# Altium schematic symbol library THU VIEN SCH.SchLib: 1083 symbols (part 1 of 5) (continued)
## LED2 (continued)
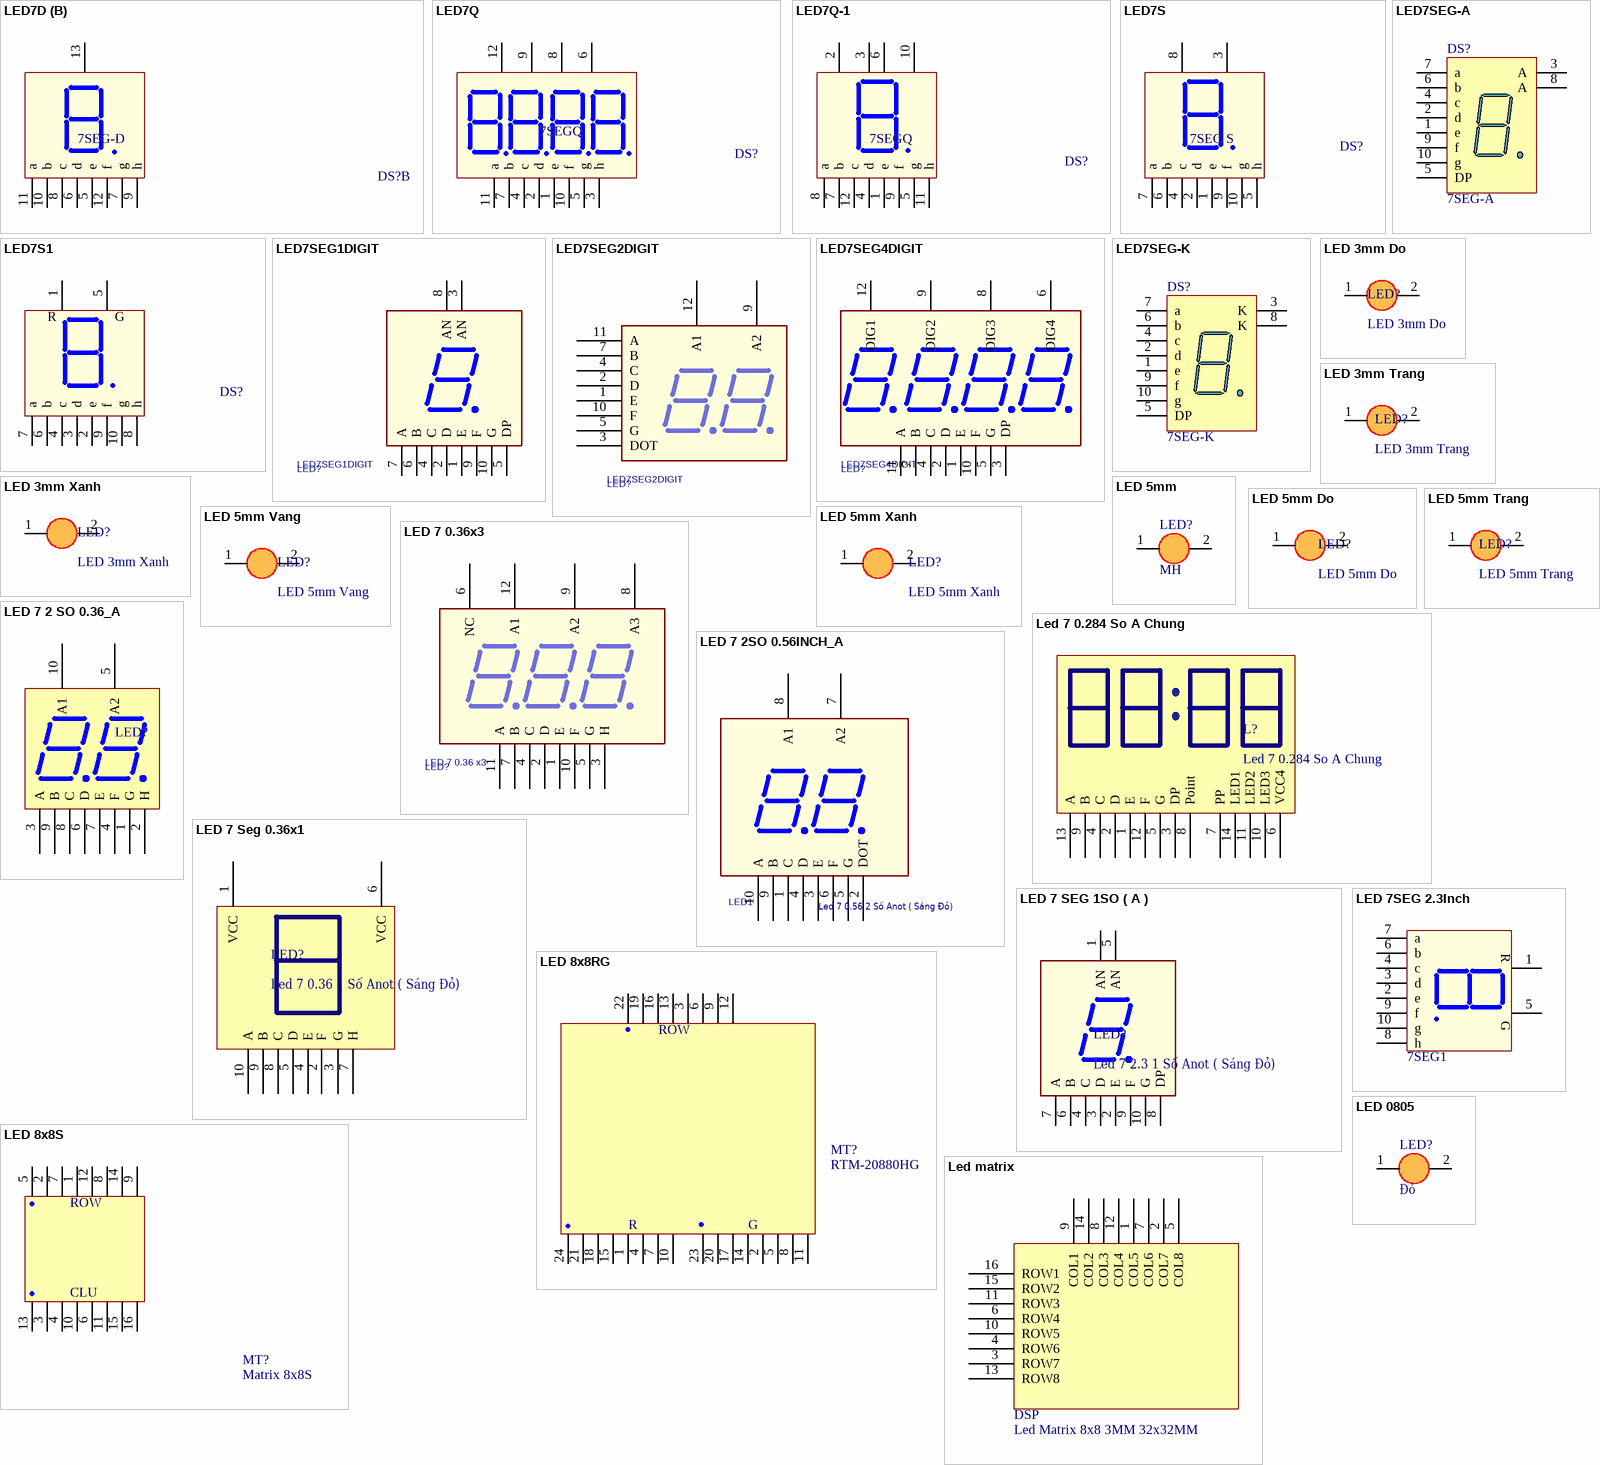
[diagram p5: symbols LED7D to Led matrix]

## LED7D
designator DS?, comment 7SEG-D
Two 7 Seg Dipslay; Value: LED 7D SEG
footprint 7SEGD (DIP 18Leads; Body 24 x 15 mm; Pitch 0.5 mm)
part A pins: 1 e, 2 d, 3 c, 4 h, 14 V1, 15 b, 16 a, 17 g, 18 f
part B pins: 5 e, 6 d, 7 g, 8 c, 9 h, 10 b, 11 a, 12 f, 13 V2

## LED7Q
designator DS?, comment 7SEGQ
Four 7 Seg Dipslay; Value: LED 7Q SEG
footprint 7SEGQ (DIP 12 Leads; Body 48 x 20 mm; Pitch 0.5 mm)
pins: 1 e, 2 d, 3 h, 4 c, 5 g, 6 V4, 7 b, 8 V3, 9 V2, 10 f, 11 a, 12 V1

## LED7Q-1
designator DS?, comment 7SEGQ
Four 7 Seg Dipslay; Value: LED 7Q SEG
footprint 7SEGQ (DIP 12 Leads; Body 48 x 20 mm; Pitch 0.5 mm)
pins: 1 e, 2 V1, 3 V2, 4 d, 5 g, 6 V3, 7 b, 8 a, 9 f, 10 V4, 11 h, 12 c

## LED7S
designator DS?, comment 7SEG S
Single 7 Seg Dipslay; Value: LED 7S SEG
footprint 7SEGS (DIP 10 Leads; Body 12 x 15 mm; Pitch 0.5 mm)
pins: 1 e, 2 d, 3 Vcc, 4 c, 5 h, 6 b, 7 a, 8 Vcc, 9 f, 10 g

## LED7S1
designator DS?, comment 7SEG S  (value not drawn)
Single 7 Seg Dipslay 29x41 mm; Value: LED 7S SEG
footprint 7SEG_29x41 (DIP 10 Leads; Body 29 x 41 mm; Pitch 0.5 mm)
footprint 7SEG_37x55 (DIP 10 Leads; Body 29 x 41 mm; Pitch 0.5 mm)
pins: 1 R, 2 e, 3 d, 4 c, 5 COM, 6 b, 7 a, 8 h, 9 f, 10 g
text: G

## LED7SEG1DIGIT
designator LED?
footprint LED 7SEG 1DIGIT
pins: 1 E, 2 D, 3 AN, 4 C, 5 DP, 6 B, 7 A, 8 AN, 9 F, 10 G

## LED7SEG2DIGIT
designator LED?
footprint Led 7seg 3 digit (DIP; 14 Leads (2 Absent); Row Spacing 7.62 mm; Pitch 2.54 mm)
pins: 1 E, 2 D, 3 DOT, 4 C, 5 G, 7 B, 9 A2, 10 F, 11 A, 12 A1

## LED7SEG4DIGIT
designator LED?
footprint LED 7SEG 4 DIGIT (LED 7SEG 4DIGIT)
pins: 1 E, 2 D, 3 DP, 4 C, 5 G, 6 DIG4, 7 B, 8 DIG3, 9 DIG2, 10 F, 11 A, 12 DIG1

## LED7SEG-A
designator DS?, comment 7SEG-A
14.2 mm General Purpose Blue 7-Segment Display: CA, RH DP, Gray Surface; MinimumIntensity: 2020 ucd; Note: IF = 10 mA; Published: 8-Jun-2000; LatestRevisionDate: 17-Dec-2003; LatestRevisionNote: Schematic revised, PCB Footprint replaced.; DatasheetDocument: 24-Sep-2002; PackageDocument: 24-Sep-2002; PackageReference: H; Publisher: Altium Limited; Colour: Blue; ComponentLink1Description: Manufacturer Link; ComponentLink1URL: http://www.agilent.com/
footprint LED7SEG
footprint LED 7SEG 0.8IN ANOT
pins: 1 e "Cathode", 2 d "Cathode", 3 A "Common Anode", 4 c "Cathode", 5 DP "Cathode", 6 b "Cathode", 7 a "Cathode", 8 A "Common Anode", 9 f "Cathode", 10 g "Cathode"

## LED7SEG-K
designator DS?, comment 7SEG-K
14.2 mm General Purpose Blue 7-Segment Display: CC, RH DP, Gray Surface; MinimumIntensity: 2020 ucd; Note: IF = 10 mA; Published: 8-Jun-2000; LatestRevisionDate: 17-Dec-2003; LatestRevisionNote: Schematic revised, PCB Footprint replaced.; DatasheetDocument: 24-Sep-2002; PackageDocument: 24-Sep-2002; PackageReference: H; Publisher: Altium Limited; Colour: Blue; ComponentLink1Description: Manufacturer Link; ComponentLink1URL: http://www.agilent.com/
footprint LED7SEG
pins: 1 e "Anode", 2 d "Anode", 3 K "Common Cathode", 4 c "Anode", 5 DP "Anode", 6 b "Anode", 7 a "Anode", 8 K "Common Cathode", 9 f "Anode", 10 g "Anode"

## LED 3mm Do
designator LED?
Cắm; Ten_Linh_Kien: LED 3MM Sáng Đỏ ( SS); Ma_Hang: MH004931; Don_Vi: Con; Ghi_Chu: *; Kieu_Chan: *; Chung_Loai: Cắm
footprint LED 3mm Do (Footprintf LED phi 3)
pins: 1 A, 2 K

## LED 3mm Trang
designator LED?
Cắm; Ten_Linh_Kien: LED 3MM Sáng Trắng ( SS); Ma_Hang: MH004932; Don_Vi: Con; Ghi_Chu: *; Kieu_Chan: *; Chung_Loai: Cắm
footprint LED_phi 3 (LED phi 3)
pins: 1 A, 2 K

## LED 3mm Xanh
designator LED?
Cắm; Ten_Linh_Kien: LED 3MM Xanh Lá ( SS); Ma_Hang: MH004935; Don_Vi: Con; Ghi_Chu: *; Kieu_Chan: *; Chung_Loai: Cắm
footprint LED 3MM XANH
pins: 1 A, 2 K

## LED 5mm
designator LED?, comment MH
Cắm; Don_Vi: Con; Ten_Linh_Kien: *; Ghi_Chu: *; Kieu_Chan: *; Ma_Hang: *; Chung_Loai: Con
footprint LED5MM
pins: 1 A, 2 K

## LED 5mm Do
designator LED?
Cắm; Ten_Linh_Kien: LED 3MM Xanh Lá ( SS); Ma_Hang: MH004935; Don_Vi: Con; Ghi_Chu: *; Kieu_Chan: *; Chung_Loai: Cắm
footprint LED 5mm DO (LED 2 PIN, 5 ly , Only colour, pin to pin 110mil)
pins: 1 A, 2 K

## LED 5mm Trang
designator LED?
Cắm; Ten_Linh_Kien: Led 5MM Trắng (SS); Ma_Hang: MH002127; Don_Vi: Con; Ghi_Chu: *; Kieu_Chan: *; Chung_Loai: Cắm
footprint LED 5mm DO (LED 2 PIN, 5 ly , Only colour, pin to pin 110mil)
pins: 1 A, 2 K

## LED 5mm Vang
designator LED?
Cắm; Ten_Linh_Kien: Led 5MM Vàng (SS); Ma_Hang: MH002126; Don_Vi: Con; Ghi_Chu: *; Kieu_Chan: *; Chung_Loai: Cắm
footprint LED 5mm Vang
pins: 1 A, 2 K

## LED 5mm Xanh
designator LED?
Cắm; Ten_Linh_Kien: Led 5MM Xanh Lá (SS); Ma_Hang: MH002125; Don_Vi: Con; Ghi_Chu: *; Kieu_Chan: *; Chung_Loai: Cắm
footprint LED 5mm Xanh (LED 2 PIN, 5 ly , Only colour,pin to pin 100mil)
pins: 1 A, 2 K

## LED 7 0.36x3
designator LED?, comment LED 7 0.36 x3
footprint Led 7seg 3 digit (DIP; 14 Leads (2 Absent); Row Spacing 7.62 mm; Pitch 2.54 mm)
pins: 1 E, 2 D, 3 H, 4 C, 5 G, 6 NC, 7 B, 8 A3, 9 A2, 10 F, 11 A, 12 A1

## Led 7 0.284 So A Chung
designator L?
Cắm; Ten_Linh_Kien: Led 7 0.28 4 Số Anot ( Màu Đỏ); Don_Vi: Con; Ma_Hang: MH003649; Ghi_Chu: *; Kieu_Chan: *; Chung_Loai: Cắm
footprint Led 7 Thanh 0.56 - Clock
pins: 1 E, 2 D, 3 DP, 4 C, 5 G, 6 VCC4, 7 PP, 8 Point, 9 B, 10 LED3, 11 LED2, 12 F, 13 A, 14 LED1

## LED 7 2 SO 0.36_A
designator LED?, comment Led 7 0.36 3 Số Anot ( Sáng Đỏ)  (value not drawn)
Cắm; Don_Vi: Con; Ma_Hang: MH001046; Ten_Linh_Kien: Led 7 0.36 3 Số Anot ( Sáng Đỏ); Ghi_Chu: *; Kieu_Chan: *; Chung_Loai: Cắm
footprint 7 Seg 0.36x2
pins: 1 G, 2 H, 3 A, 4 F, 5 A2, 6 D, 7 E, 8 C, 9 B, 10 A1

## LED 7 2SO 0.56INCH_A
designator LED1, comment Led 7 0.56 2 Số Anot ( Sáng Đỏ)
Cắm; Ma_Hang: MH001040; Don_Vi: Con; Ten_Linh_Kien: Led 7 0.56 2 Số Anot ( Sáng Đỏ); Ghi_Chu: *; Kieu_Chan: *; Chung_Loai: Cắm
footprint LED 7SEGx2 0.56
pins: 1 C, 2 DOT, 3 E, 4 D, 5 G, 6 F, 7 A2, 8 A1, 9 B, 10 A

## LED 7 Seg 0.36x1
designator LED?, comment Led 7 0.36 1 Số Anot ( Sáng Đỏ)
Cắm; Don_Vi: Con; Ma_Hang: MH001607; Ten_Linh_Kien: Led 7 0.36 1 Số Anot ( Sáng Đỏ); Ghi_Chu: *; Kieu_Chan: *; Chung_Loai: Cắm
footprint 7SEG_0.36 (led 7 - 0.36 - 10 pin)
pins: 1 VCC, 2 F, 3 G, 4 E, 5 D, 6 VCC, 7 H, 8 C, 9 B, 10 A

## LED 7 SEG 1SO ( A )
designator LED?, comment Led 7 2.3 1 Số Anot ( Sáng Đỏ)
Cắm; Don_Vi: Con; Ma_Hang: MH000901; Ten_Linh_Kien: Led 7 2.3 1 Số Anot ( Sáng Đỏ); Ghi_Chu: *; Kieu_Chan: *; Chung_Loai: Cắm
pins: 1 AN, 2 E, 3 D, 4 C, 5 AN, 6 B, 7 A, 8 DP, 9 F, 10 G

## LED 7SEG 2.3Inch
designator 7SEG1, comment Led 7 Thanh 2.3 Inch Anot  (value not drawn)
Single 7 Seg Dipslay 29x41 mm; Value: LED 7S SEG
footprint LED 7 THANH 2.3INCH
footprint 7SEG_37x55 (DIP 10 Leads; Body 29 x 41 mm; Pitch 0.5 mm)
footprint LED 7 Thanh 2.3INCH
pins: 1 R, 2 e, 3 d, 4 c, 5 COM, 6 b, 7 a, 8 h, 9 f, 10 g
text: G

## LED 8x8RG
designator MT?, comment RTM-20880HG
Matrix 8x8, Two colour; Value: Matrix 8x8 two colour
footprint 8x8RG (Matran 8x8 2mau,Body 60 X 60mm)
pins: 1 R5, 2 G5, 3 H5, 4 R6, 5 G6, 6 H6, 7 R7, 8 G7, 9 H7, 10 R8, 11 G8, 12 H8, 13 H4, 14 G4, 15 R4, 16 H3, 17 G3, 18 R3, 19 H2, 20 G2, 21 R2, 22 H1, 23 G1, 24 R1
text: ROW; R; G

## LED 8x8S
designator MT?, comment Matrix 8x8S
Matrix 8x8,  Single colour; Value: Matrix 8x8S
footprint 8x8S (Matran 8x8, Body 60 X 60mm)
pins: 1 H4, 2 H2, 3 C2, 4 C3, 5 H1, 6 C5, 7 H3, 8 H6, 9 H8, 10 C4, 11 C6, 12 H5, 13 C1, 14 H7, 15 C7, 16 C8
text: ROW; CLU

## LED 0805
designator LED?, comment Đỏ
Dán; Don_Vi: Con; Chung_Loai: Cắm; Ten_Linh_kien: *; Ghi_Chu: *; Kieu_Chan: *; Ma_Hang: *
footprint led 0805
pins: 1 A, 2 K

## Led matrix
designator DSP, comment Led Matrix 8x8 3MM 32x32MM
Cắm; Ten_Linh_Kien: Led Matrix 8x8 3MM 32x32MM ( 1 Mầu Katot); Don_Vi: Con; Ma_Hang: MH003635; Ghi_Chu: *; Kieu_Chan: *; Chung_Loai: Cắm
footprint Matrix SBM1388 (Matrix 8x8)
pins: 1 COL5, 2 COL7, 3 ROW7, 4 ROW6, 5 COL8, 6 ROW4, 7 COL6, 8 COL3, 9 COL1, 10 ROW5, 11 ROW3, 12 COL4, 13 ROW8, 14 COL2, 15 ROW2, 16 ROW1

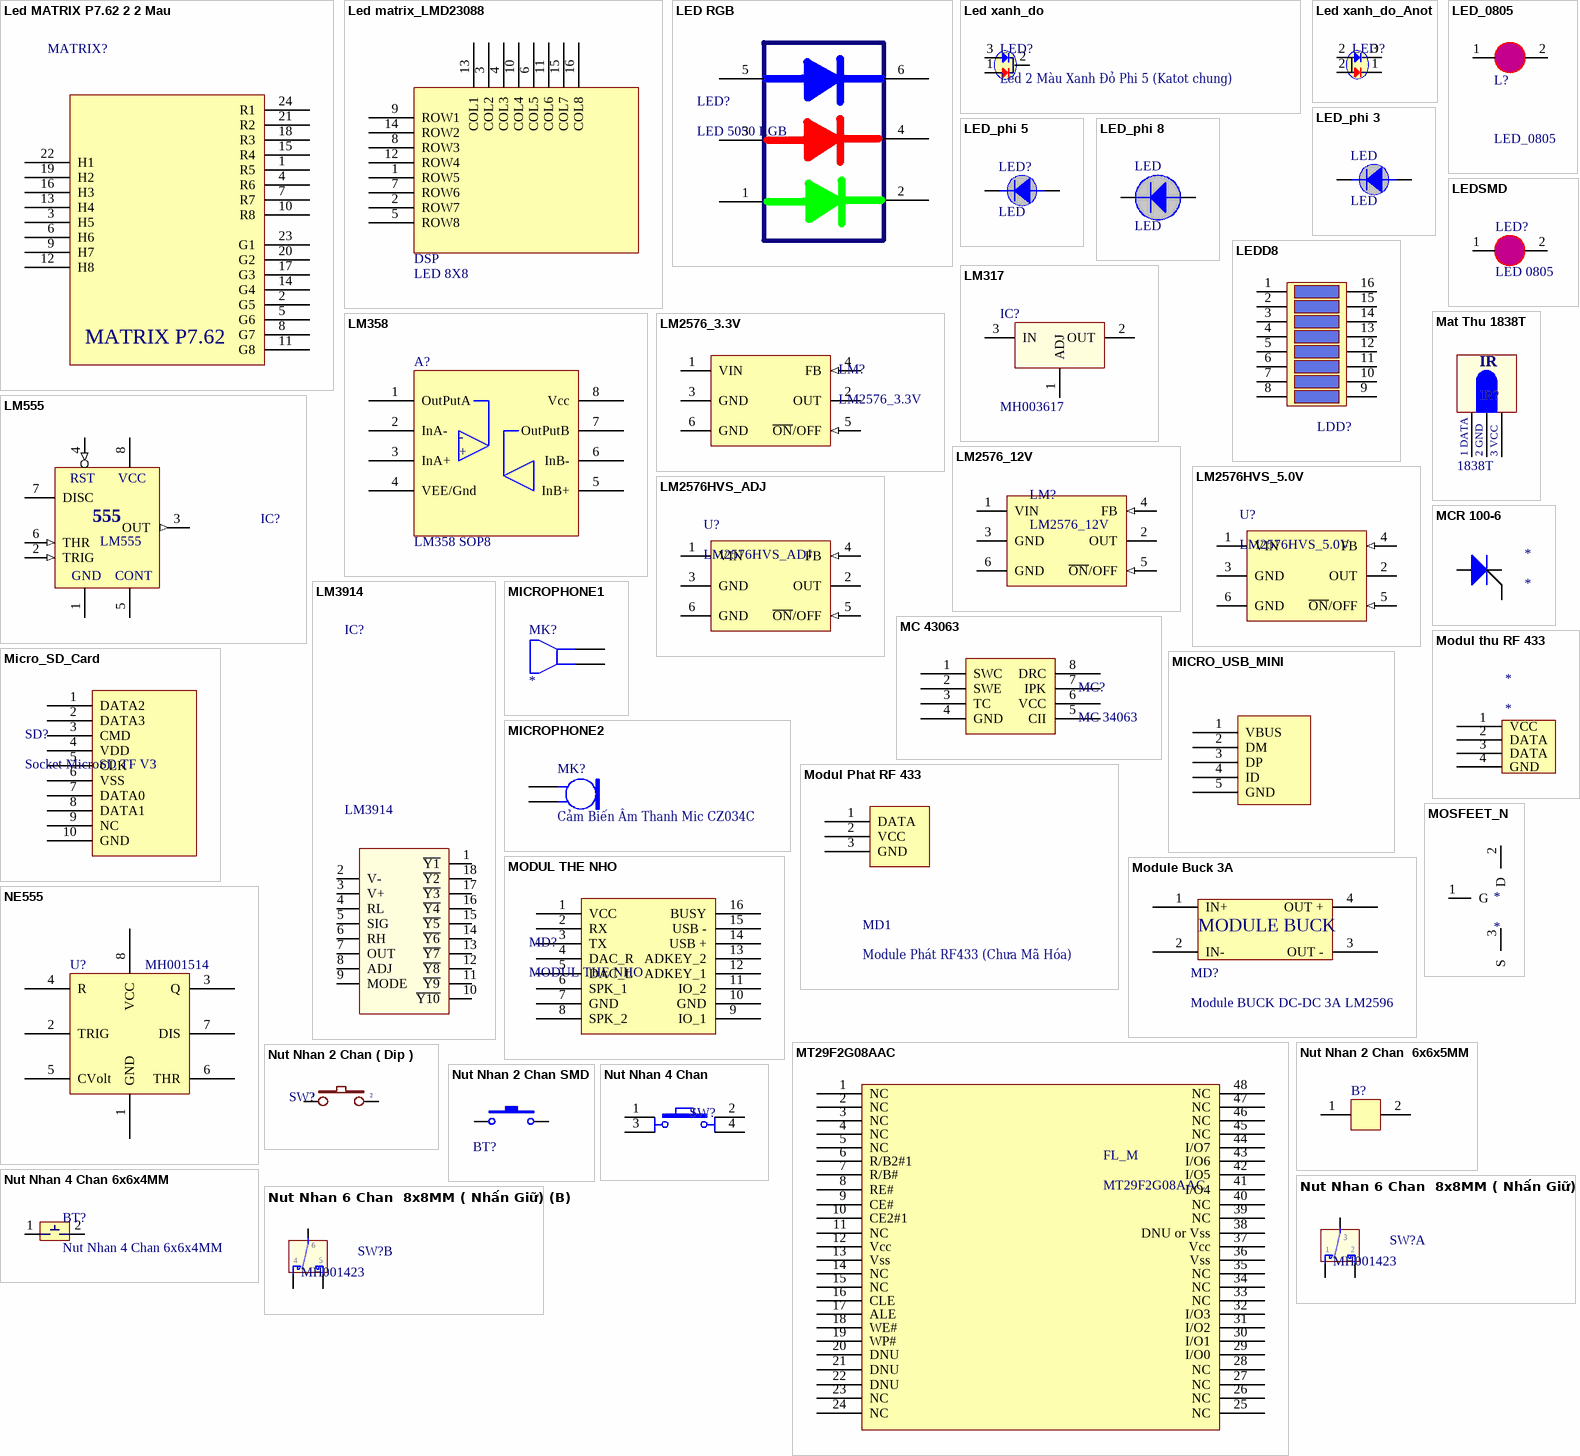
[diagram p6: symbols Led MATRIX P7.62 2 2 Mau to Nut Nhan 6 Chan  8x8MM ( Nhấn Giữ)]

## Led MATRIX P7.62 2 2 Mau
designator MATRIX?, comment LED Matrix P7.62 3 Màu  (value not drawn)
footprint LED Matrix P7.62
pins: 1 R5, 2 G5, 3 H5, 4 R6, 5 G6, 6 H6, 7 R7, 8 G7, 9 H7, 10 R8, 11 G8, 12 H8, 13 H4, 14 G4, 15 R4, 16 H3, 17 G3, 18 R3, 19 H2, 20 G2, 21 R2, 22 H1, 23 G1, 24 R1
text: MATRIX P7.62

## Led matrix_LMD23088
designator DSP, comment LED 8X8
LED MATRIX
footprint Matrix LMD23088 (Matrix 8x8)
pins: 1 ROW5, 2 ROW7, 3 COL2, 4 COL3, 5 ROW8, 6 COL5, 7 ROW6, 8 ROW3, 9 ROW1, 10 COL4, 11 COL6, 12 ROW4, 13 COL1, 14 ROW2, 15 COL7, 16 COL8

## LED RGB
designator LED?, comment LED 5050 RGB
Dán; Don_Vi: Con; Ma_Hang: MH004716; Ten_Linh_Kien: LED 5050 RGB; Kieu_Chan: *; Ghi_Chu: *; Chung_Loai: Dán
footprint LED SMD 5050 RGB
pins: 1 VCCR, 2 VCCG, 3 VCCB, 4 GNDR, 5 GNDG, 6 GNDB

## Led xanh_do
designator LED?, comment Led 2 Màu Xanh Đỏ Phi 5 (Katot chung)
Cắm; Ma_Hang: MH001547; Don_Vi: Con; Ten_Linh_Kien: Led 2 Màu Xanh Đỏ Phi 5 (Katot chung); Ghi_Chu: *; Kieu_Chan: *; Chung_Loai: Cắm
footprint LED_phi 5_Xanh_Do (LED phi 5mm 2 mau xanh va do)
pins: 1 D, 2 Katot, 3 X

## Led xanh_do_Anot
designator LED?, comment Led 2 Màu Xanh Đỏ Phi5 (Anot chung)  (value not drawn)
Cắm; Don_Vi: Con; Ma_Hang: MH001231; Ten_Linh_Kien: Led 2 Màu Xanh Đỏ Phi5 (Anot chung); Ghi_Chu: *; Kieu_Chan: *; Chung_Loai: Cắm
footprint LED_phi 5_Xanh_Do (LED phi 5mm 2 mau xanh va do)
footprint LED_phi 5_Xanh_Do_2 (LED phi 5mm 2 mau xanh va do doc lap)
pins: 1 D, 2 Katot, 2 Katot, 3 X

## LED_0805
designator L?
Dán; Ghi_Chu: *; Kieu_Chan: *; Don_Vi: *; Chung_Loai: *; Ma_Hang: *; Ten_Linh_Kien: *
footprint CAP10UF
footprint 0805 (Compoment SMD 80x50mil)
footprint 1206
footprint led 3mm (Footprintf LED phi 3)
pins: 1 A, 2 K

## LED_phi 3
designator LED, comment LED
footprint LED_phi 3 (LED phi 3)
pins: 1 anot, 2 Katot

## LED_phi 5
designator LED?, comment LED
footprint LED_phi 5 (LED phi 5mm)
pins: 1 anot, 2 Katot

## LED_phi 8
designator LED, comment LED
footprint LED_phi 8 (LED phi 8mm)
pins: 1 anot, 2 Katot

## LEDD8
designator LDD?, comment LED DIP 8  (value not drawn)
Value: LED DIP 8
footprint DIP16/W0.3K (16 PIN, W 300mil, Pin to pin 100mil For Switch)
pins: 1, 2, 3, 4, 5, 6, 7, 8, 9, 10, 11, 12, 13, 14, 15, 16

## LEDSMD
designator LED?, comment LED 0805
Dán; Don_Vi: Con; Ten_Linh_Kien: *; Ma_Hang: *; Ghi_Chu: *; Kieu_Chan: *; Chung_Loai: Dán
footprint LED0805 (Chip Resistor; Body 2.0 x 1.3 mm (LxW typ))
pins: 1 A, 2 K

## LM317
designator IC?, comment MH003617
Dán; Value: LM317 TO223 ADJ 0.5A
footprint QTO-220 (TO-220 - 1-2-3)
footprint TO-220
pins: 1 ADJ, 2 OUT, 3 IN

## LM358
designator A?, comment LM358 SOP8
Dán; Ma_Hang: MH000609; Don_Vi: Con; Ten_Linh_Kien: LM358 SOP8; Kieu_Chan: *; Ghi_Chu: *; Chung_Loai: Dán
footprint DIP8
footprint DIP-8
pins: 1 OutPutA, 2 InA-, 3 InA+, 4 VEE/Gnd, 5 InB+, 6 InB-, 7 OutPutB, 8 Vcc
text: -; +

## LM555
designator IC?
Dán; Don_Vi: Con; Ma_Hang: MH001514; Ten_Linh_Kien: LM555; Ghi _Chu: *; Kieu_Chan: *; Chung_Loai: Dán
footprint DIP8 (W.300/L.400)
pins: 1 GND (power), 2 TRIG (in), 3 OUT (out), 4 RST (in), 5 CONT, 6 THR (in), 7 DISC (oc), 8 VCC (power)
text: 555

## LM2576_3.3V
designator LM?
Dán; Don_Vi: Con; Ma_Hang: MH001260; Ten_Linh_Kien: LM2576S-3.3V BUCK 3.3V 3A TO263-5; Ghi_Chu: *; Kieu_Chan: *; Chung_Loai: Dán
footprint LM2576 NEW
pins: 1 VIN (power), 2 OUT (power), 3 GND (power), 4 FB (in), 5 ~{ON}/OFF (in), 6 GND

## LM2576_12V
designator LM?
Dán; Don_Vi: Con; Ma_Hang: MH001260; Ten_Linh_Kien: LM2576S-3.3V BUCK 3.3V 3A TO263-5; Ghi_Chu: *; Kieu_Chan: *; Chung_Loai: Dán
footprint LM2576 NEW
pins: 1 VIN (power), 2 OUT (power), 3 GND (power), 4 FB (in), 5 ~{ON}/OFF (in), 6 GND

## LM2576HVS_5.0V
designator U?
Dán; Ten_Linh_Kien: LM2576HVS-5.0V BUCK 5V 3A TO263-5; Don_Vi: Con; Ma_Hang: MH002362; Ghi_Chu: *; Kieu_Chan: *; Chung_Loai: Dán
footprint LM2576 NEW
pins: 1 VIN (power), 2 OUT (power), 3 GND (power), 4 FB (in), 5 ~{ON}/OFF (in), 6 GND

## LM2576HVS_ADJ
designator U?
Dán; Ten_Linh_Kien: LM2576HVS-ADJ BUCK ADJ 3A TO263-5; Don_Vi: Con; Ma_Hang: MH002361; Ghi_Chu: *; Kieu_Chan: *; Chung_Loai: Dán
footprint LM2576 NEW
pins: 1 VIN (power), 2 OUT (power), 3 GND (power), 4 FB (in), 5 ~{ON}/OFF (in), 6 GND

## LM3914
designator IC?
Cắm; Ten_Linh_Kien: LM3914 DIP18; Don_Vi: Con; Ma_Hang: MH002419; Ghi_Chu: *; Kieu_Chan: *; Chung_Loai: Cắm
footprint DIP18/W0.3 (18 PIN, W 300mil, Pin to pin 100mil)
pins: 1 ~{Y1}, 2 V-, 3 V+, 4 RL, 5 SIG, 6 RH, 7 OUT, 8 ADJ, 9 MODE, 10 ~{Y10}, 11 ~{Y9}, 12 ~{Y8}, 13 ~{Y7}, 14 ~{Y6}, 15 ~{Y5}, 16 ~{Y4}, 17 ~{Y3}, 18 ~{Y2}

## Mat Thu 1838T
designator IR?  (value not drawn)
footprint IR (Receiver Infared IC)
pins: 1 DATA, 2 GND, 3 VCC
text: IR; 1 DATA; 2 GND; 3 VCC; 1838T

## MC 43063
designator MC?, comment MC 34063
Dán; Ghi_Chu: *; Kieu_Chan: *; Don_Vi: *; Ma_Hang: *; Chung_Loai: *; Ten_Linh_Kien: *
footprint SO-8 (8-Pin Small Outline Integrated Circuit 1.27 mm Pitch, IPC Medium Density)
pins: 1 SWC, 2 SWE, 3 TC, 4 GND, 5 CII, 6 VCC, 7 IPK, 8 DRC

## MCR 100-6
designator *
pins: 1 K, 2 A, 3 G

## Micro_SD_Card
designator SD?, comment Socket MicroSD TF V3
Dán; Ten_Linh_Kien: Socket MicroSD TF V3 ( Soket Thẻ Nhớ); Don_Vi: Con; Ma_Hang: MH001914; Ghi_Chu: *; Kieu_Chan: *; Chung_Loai: Dán
footprint MicroSD_TF_V1
footprint MicroSD_TF_V3
pins: 1 DATA2, 2 DATA3, 3 CMD, 4 VDD, 5 CLK, 6 VSS, 7 DATA0, 8 DATA1, 9 NC, 10 GND

## MICRO_USB_MINI
designator MCR1
footprint Micro USB mini DIP
pins: 1 VBUS, 2 DM, 3 DP, 4 ID, 5 GND

## MICROPHONE1
designator MK?
Microphone
pins: 1, 2

## MICROPHONE2
designator MK?, comment Cảm Biến Âm Thanh Mic CZ034C
Microphone; Ma_Hang: MH004597; Don_Vi: Con; Chung_Loai: Cắm; Kieu_Chan: *; Ten_Linh_Kien: Cảm Biến Âm Thanh Mic CZ034C; Ghi_Chu: *
pins: 1, 2

## Modul Phat RF 433
designator MD1, comment Module Phát RF433 (Chưa Mã Hóa)
Dán; Ma_Hang: MH000581; Don_Vi: Con; Ten_Linh_Kien: Module Phát RF433 (Chưa Mã Hóa); Ghi_Chu: *; Chung_Loai: Dán; Kieu_Chan: *
footprint Modul Phat RF 433
pins: 1 DATA, 2 VCC, 3 GND

## MODUL THE NHO
designator MD?
footprint MODUL MP3
pins: 1 VCC, 2 RX, 3 TX, 4 DAC_R, 5 DAC_L, 6 SPK_1, 7 GND, 8 SPK_2, 9 IO_1, 10 GND, 11 IO_2, 12 ADKEY_1, 13 ADKEY_2, 14 USB +, 15 USB -, 16 BUSY

## Modul thu RF 433
designator *
pins: 1 VCC , 2 DATA, 3 DATA, 4 GND